# Altium footprint library 3D封装库.PcbLib: 716 footprints (part 39 of 45)
Each footprint in its own frame and in the unit in brackets; x right, y up, seen from the top. Pads: shape width x height; smd on the part's side, far side on the other; paste and mask are expansions set on the pad; w line width, h text height; cw(c..) or ccw(c..) is an arc to the next point about the centre after c.
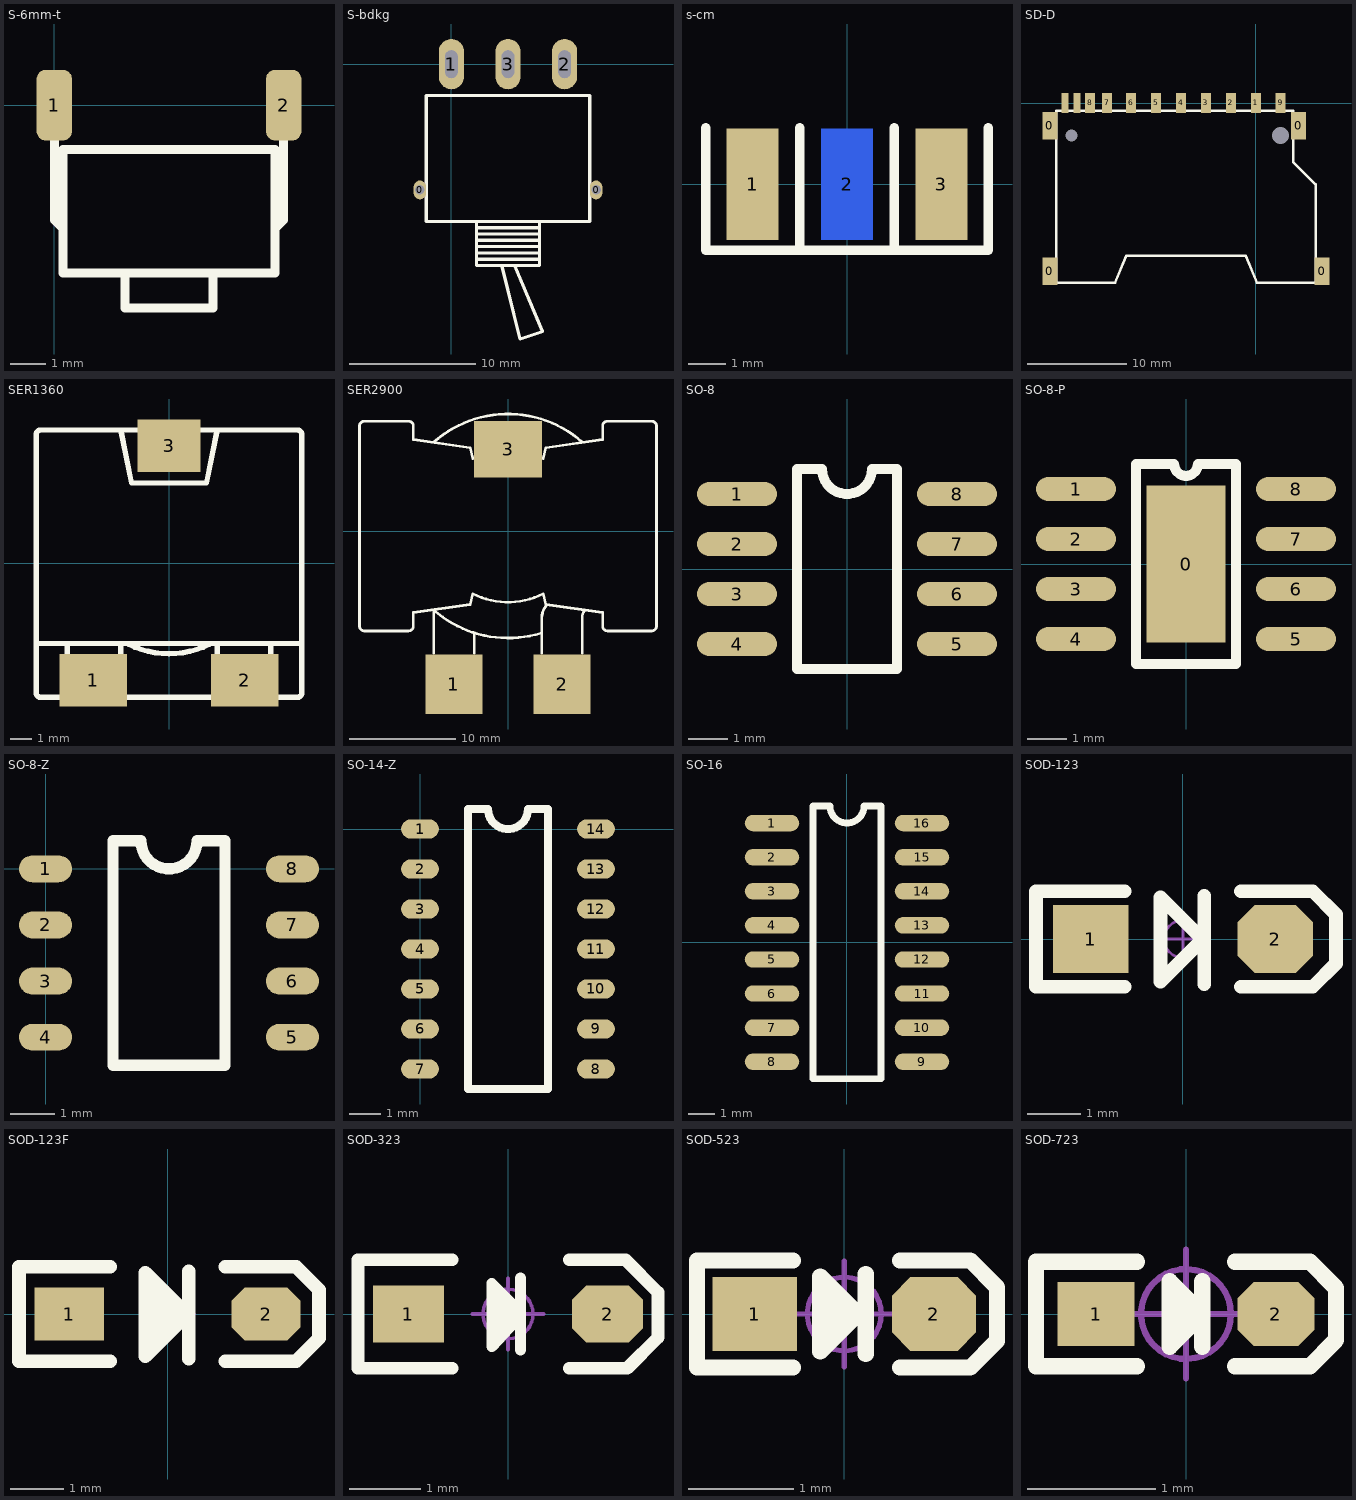
[diagram p38: the footprints below, top view; thin cyan lines are the x and y axes]

## S-6mm-t [mm]
pads (2):
  rrect50% 1x2 smd: 1(0,0) 2(6.5,0)
Top Overlay:
  lines w0.254: 0,-1 0,-3.25 0.25,-3.5 ; 2,-4.75 2,-5.75 4.5,-5.75 4.5,-4.75 ; 6.25,-3.5 6.5,-3.25 6.5,-1 ; 0.25,-4.75 6.25,-4.75 6.25,-1.25 0.25,-1.25 0.25,-4.75

## S-bdkg [mm]
pads (5):
  oval 1x1.5 hole 0.75: 0(-2.5,-10) 0(11.5,-10)
  oval 2x4 hole 1 slot 2.2 at 90 deg: 1(0,0) 2(9,0) 3(4.5,0)
Top Overlay:
  lines w0.254: 2,-15.5 7,-15.5 ; 2,-15 7,-15 ; 2,-14.5 7,-14.5 ; 2,-13.5 7,-13.5 ; 2,-13 7,-13 ; 2,-12.5 2,-14 ; 4,-16 5.462,-21.846 7.25,-21.25 5,-16 ; 7,-12.5 7,-14 ; 2,-14 2,-16 7,-16 7,-14 ; 2,-14 7,-14 ; -2,-12.5 -2,-2.5 4.5,-2.5 11,-2.5 11,-12.5 -2,-12.5
3D body: height 4, standoff 1, extent 8.5,-2.5 9.5,1
3D body: height 4, standoff 1, extent 4,-2.5 5,1
3D body: height 4, standoff 1, extent -0.5,-2.5 0.5,1
3D body: height 4, standoff 0, extent 8.5,-1 9.5,1
3D body: height 4, standoff 0, extent 4,-1 5,1
3D body: height 4, standoff 0, extent -0.5,-1 0.5,1
3D body: height 8, standoff 0, extent -2,-12.5 11,-2.5
3D body: height 6.5, standoff 1.5, extent 2.001,-16 6.999,-12.5

## s-cm [mm]
pads (3):
  rect 1.4x3 smd: 1(-2.54,0) 3(2.54,0)
  rect 1.4x3 smd far side: 2(0,0)
Top Overlay:
  lines w0.254: -3.81,1.524 -3.81,-1.778 3.81,-1.778 3.81,1.524 ; -1.27,-1.778 -1.27,1.524 ; 1.27,-1.778 1.27,1.524
Bottom Overlay:
  lines w0.254: -3.81,1.524 -3.81,-1.778 3.81,-1.778 3.81,1.524 ; -1.27,-1.778 -1.27,1.524 ; 1.27,-1.778 1.27,1.524

## SD-D [mm]
pads (17):
  rect 1.5x2.8 smd: 0(-20.65,-16.85) 0(-20.65,-2.25) 0(4.3,-2.25) 0(6.65,-16.85)
  rect 0x0 hole 1.2: 0(-18.5,-3.25)
  rect 0x0 hole 1.7: 0(2.5,-3.25)
  rect 1x2 smd: 1(0,0.05) 2(-2.5,0.05) 3(-5,0.05) 4(-7.5,0.05) 5(-10,0.05) 6(-12.5,0.05) 7(-14.925,0.05) 8(-16.625,0.05) 9(2.5,0.05)
  rect 0.7x2 smd: 10(-17.925,0.05) 11(-19.125,0.05)
Top Overlay:
  lines w0.254: -20,-18 -20,-0.75 3.75,-0.75 3.75,-5.88 3.75,-5.9 6,-8.15 6,-18 0.12,-18 -1,-15.31 -13,-15.31 -14.12,-18 -20,-18
3D body "SW3dPS-SD SOKET HAFIZALI.STEP": height 3.01, standoff -0.99, extent -21.05,-34.75 7.55,0.75

## SER1360 [mm]
pads (3):
  rect 3.2x2.5 smd: 1(-3.605,-5.56) 2(3.605,-5.56)
  rect 3x2.5 smd: 3(0,5.588)
Top Overlay:
  lines w0.254: -6.3,-3.81 6.3,-3.81 ; -4.826,-4.318 -4.826,-3.81 ; -2.286,-4.318 -2.286,-3.81 ; -2.286,6.33 -1.778,3.81 1.778,3.81 2.286,6.33 ; -1.923,-3.846 ccw(c0,0) 1.923,-3.846 ; 2.286,-4.318 2.286,-3.81 ; 4.826,-4.318 4.826,-3.81 ; -6.3,-6.166 ccw(c-6.096,-6.166) -6.096,-6.37 6.096,-6.37 ccw(c6.096,-6.166) 6.3,-6.166 6.3,6.126 ccw(c6.096,6.126) 6.096,6.33 -6.096,6.33 ccw(c-6.096,6.126) -6.3,6.126 -6.3,-6.166

## SER2900 [mm]
pads (3):
  rect 5.33x5.59 smd: 1(-5.075,-14.355) 2(5.075,-14.355)
  rect 6.35x5.28 smd: 3(0,7.72)
Top Overlay:
  lines w0.254: -6.994,8.374 cw(c0,0.508) 6.985,8.382 ; -6.985,-7.366 ccw(c0,0.508) 3.104,-9.55 ; -6.975,-11.43 -6.975,-7.366 ; -3.175,-11.43 -3.175,-9.525 ; 3.175,-11.43 3.175,-8.103 cw(c4.909,-8.103) 3.683,-6.876 ; 6.975,-11.43 6.975,-8.022 cw(c7.876,-8.022) 7.239,-7.384 ; -13.95,-8.89 ccw(c-13.496,-8.89) -13.496,-9.344 -9.344,-9.344 ccw(c-9.344,-8.89) -8.89,-8.89 -8.89,-7.62 -3.556,-6.858 -3.302,-5.842 ccw(c0,0.508) 3.302,-5.842 3.556,-6.858 8.89,-7.62 8.89,-8.89 ccw(c9.344,-8.89) 9.344,-9.344 13.496,-9.344 ccw(c13.496,-8.89) 13.95,-8.89 13.95,9.906 ccw(c13.496,9.906) 13.496,10.36 9.344,10.36 ccw(c9.344,9.906) 8.89,9.906 8.89,8.636 3.556,7.874 3.302,6.858 ccw(c0,0.508) -3.302,6.858 -3.556,7.874 -8.89,8.636 -8.89,9.906 ccw(c-9.344,9.906) -9.344,10.36 -13.496,10.36 ccw(c-13.496,9.906) -13.95,9.906 -13.95,-8.89

## SO-8 [mil]
pads (8):
  oval 80x24 smd: 1(-110,75) 2(-110,25) 3(-110,-25) 4(-110,-75) 5(110,-75) 6(110,-25) 7(110,25) 8(110,75)
Top Overlay:
  lines w10: -50,-100 -50,100 -25,100 ccw(c0,100) 25,100 50,100 50,-100 -50,-100
3D body "SO-8.STEP": height 66.93, standoff 0, extent -117.83,-96.45 118.39,96.46

## SO-8-P [mil] "带散热焊盘"
pads (9):
  rect 78.74x157.48 smd: 0(0,0)
  oval 80x24 smd: 1(-110,75) 2(-110,25) 3(-110,-25) 4(-110,-75) 5(110,-75) 6(110,-25) 7(110,25) 8(110,75)
Top Overlay:
  lines w10: -50,-100 50,-100 50,100 11.81,100 cw(c0,100) -11.81,100 -50,100 -50,-100
3D body "SO-8.STEP": height 66.93, standoff 0, extent -117.83,-96.45 118.39,96.46

## SO-8-Z [mil]
pads (8):
  oval 47.24x24 smd: 1(0,0) 2(0,-50) 3(0,-100) 4(0,-150) 5(220,-150) 6(220,-100) 7(220,-50) 8(220,0)
Top Overlay:
  lines w10: 60,-175 160,-175 160,25 135,25 cw(c110,25) 85,25 60,25 60,-175
3D body "SO-8.STEP": height 66.93, standoff 0, extent -7.83,-171.45 228.39,21.46

## SO-14-Z [mil]
pads (14):
  oval 47.24x24 smd: 1(0,0) 2(0,-50) 3(0,-100) 4(0,-150) 5(0,-200) 6(0,-250) 7(0,-300) 8(220,-300) 9(220,-250) 10(220,-200) 11(220,-150) 12(220,-100) 13(220,-50) 14(220,0)
Top Overlay:
  lines w10: 60,-325 160,-325 160,25 135,25 cw(c110,25) 85,25 60,25 60,-325
3D body "SOP14.STEP": height 63.39, standoff 0, extent -11.04,-321.26 233.05,21.26

## SO-16 [mil]
pads (16):
  oval 80x24 smd: 1(-110,175) 2(-110,125) 3(-110,75) 4(-110,25) 5(-110,-25) 6(-110,-75) 7(-110,-125) 8(-110,-175) 9(110,-175) 10(110,-125) 11(110,-75) 12(110,-25) 13(110,25) 14(110,75) 15(110,125) 16(110,175)
Top Overlay:
  lines w10: -50,-200 -50,200 -25,200 ccw(c0,200) 25,200 50,200 50,-200 -50,-200
3D body "SOP-16.STEP": height 72.05, standoff 0, extent -115.72,-195.85 120.5,197.85

## SOD-123 [mil] "2.7x1.6X1.1mm（长宽高，不包括引脚）"
pads (2):
  rect 55x50 smd: 1(-67.5,0)
  oct 55x50 smd: 2(67.5,0)
Top Overlay:
  lines w10: -42.5,-35 -107.5,-35 -107.5,35 -42.5,35 ; 14,-0.8 -16.4,-31.2 -16.4,30.5 15.6,-1.5 ; 15.6,-33.1 15.6,31.7 ; 42.5,-35 95,-35 112,-18 112,18 95,35 42.5,35
Mechanical 15:
  circle w1.97: c0,0 r13.78
  lines w1.97: -19.68,0 19.68,0 ; 0,-19.68 0,19.68
3D body "SOD-123.STEP": height 48.03, standoff 0, extent -72.84,-31.5 72.83,31.5

## SOD-123F [mm] "2.7x1.6X1.1mm（长宽高，不包括引脚）"
pads (2):
  rect 1.3x1 smd: 1(-1.85,0)
  oct 1.3x1 smd: 2(1.85,0)
Top Overlay:
  lines w0.254: -1.079,-0.889 -2.794,-0.889 -2.794,0.889 -1.079,0.889 ; -0.254,0.559 -0.229,-0.432 0.254,0 0,0.254 0,0 0,-0.254 ; 0.356,-0.02 -0.417,-0.792 -0.417,0.775 0.396,-0.038 ; 0.396,-0.841 0.396,0.805 ; 1.079,-0.889 2.413,-0.889 2.845,-0.457 2.845,0.457 2.413,0.889 1.079,0.889
Mechanical 15:
  circle w0.05: c0,0 r0.35
  lines w0.05: -0.5,0 0.5,0 ; 0,-0.5 0,0.5
3D body "SOD-123F.STEP": height 1.15, standoff 0.04, extent -1.9,-0.8 1.9,0.8

## SOD-323 [mm] "1.8x1.3X0.9mm（长宽高，不包括引脚）"
pads (2):
  rect 1x0.8 smd: 1(-1.4,0)
  oct 1x0.8 smd: 2(1.4,0)
Top Overlay:
  lines w0.152: 0.178,-0.508 0.178,0.508 ; 0.178,-0.025 -0.229,-0.457 -0.229,0.432 0.178,0.025
  lines w0.178: -0.787,-0.762 -2.108,-0.762 -2.108,0.762 -0.787,0.762 ; 0.864,-0.762 1.676,-0.762 2.108,-0.33 2.108,0.305 1.651,0.762 0.864,0.762
  lines w0.254: -0.127,0.254 -0.152,-0.178 0.025,-0.025 -0.025,0.127
Mechanical 15:
  circle w0.05: c0,0 r0.35
  lines w0.05: -0.5,0 0.5,0 ; 0,-0.5 0,0.5
3D body "SOD-323.STEP": height 1, standoff 0.04, extent -1.337,-0.631 1.311,0.669

## SOD-523 [mm] "1.2x0.8X0.6mm（长宽高，不包括引脚）"
pads (2):
  rect 0.8x0.7 smd: 1(-0.85,0)
  oct 0.8x0.7 smd: 2(0.85,0)
Top Overlay:
  rectangle: -0.178,-0.178 0,0.178
  lines w0.152: -0.488,-0.508 -1.397,-0.508 -1.397,0.508 -0.488,0.508 ; -0.127,0 0.127,0 ; 0.203,-0.381 0.203,0.381 ; 0.528,-0.508 1.194,-0.508 1.448,-0.254 1.448,0.254 1.194,0.508 0.528,0.508 ; 0.127,0 -0.229,0.356 -0.229,-0.356 0.127,0
Mechanical 15:
  circle w0.05: c0,0 r0.35
  lines w0.05: -0.5,0 0.5,0 ; 0,-0.5 0,0.5
3D body "SOD-523.STEP": height 0.65, standoff 0.05, extent -0.8,-0.4 0.8,0.4

## SOD-723 [mm] "1x0.6X0.5mm（长宽高，不包括引脚）"
pads (2):
  rect 0.6x0.5 smd: 1(-0.7,0)
  oct 0.6x0.5 smd: 2(0.7,0)
Top Overlay:
  lines w0.127: -0.381,-0.406 -1.168,-0.406 -1.168,0.406 -0.381,0.406 ; 0,-0.127 0,0.127 -0.127,0.254 ; 0.127,-0.254 0.127,0.254 ; 0.381,-0.406 0.965,-0.406 1.168,-0.203 1.168,0.203 0.965,0.406 0.381,0.406 ; -0.127,0.254 0.127,0 -0.127,-0.254 -0.127,0.254
Mechanical 15:
  circle w0.05: c0,0 r0.35
  lines w0.05: -0.5,0 0.5,0 ; 0,-0.5 0,0.5
3D body "SOD-723.STEP": height 0.53, standoff 0.03, extent -0.7,-0.3 0.7,0.3